# Altium footprint library IC.PcbLib: 386 footprints (part 30 of 30)
Each footprint in its own frame and in the unit in brackets; x right, y up, seen from the top. Pads: shape width x height; smd on the part's side, far side on the other; paste and mask are expansions set on the pad; w line width, h text height; cw(c..) or ccw(c..) is an arc to the next point about the centre after c.
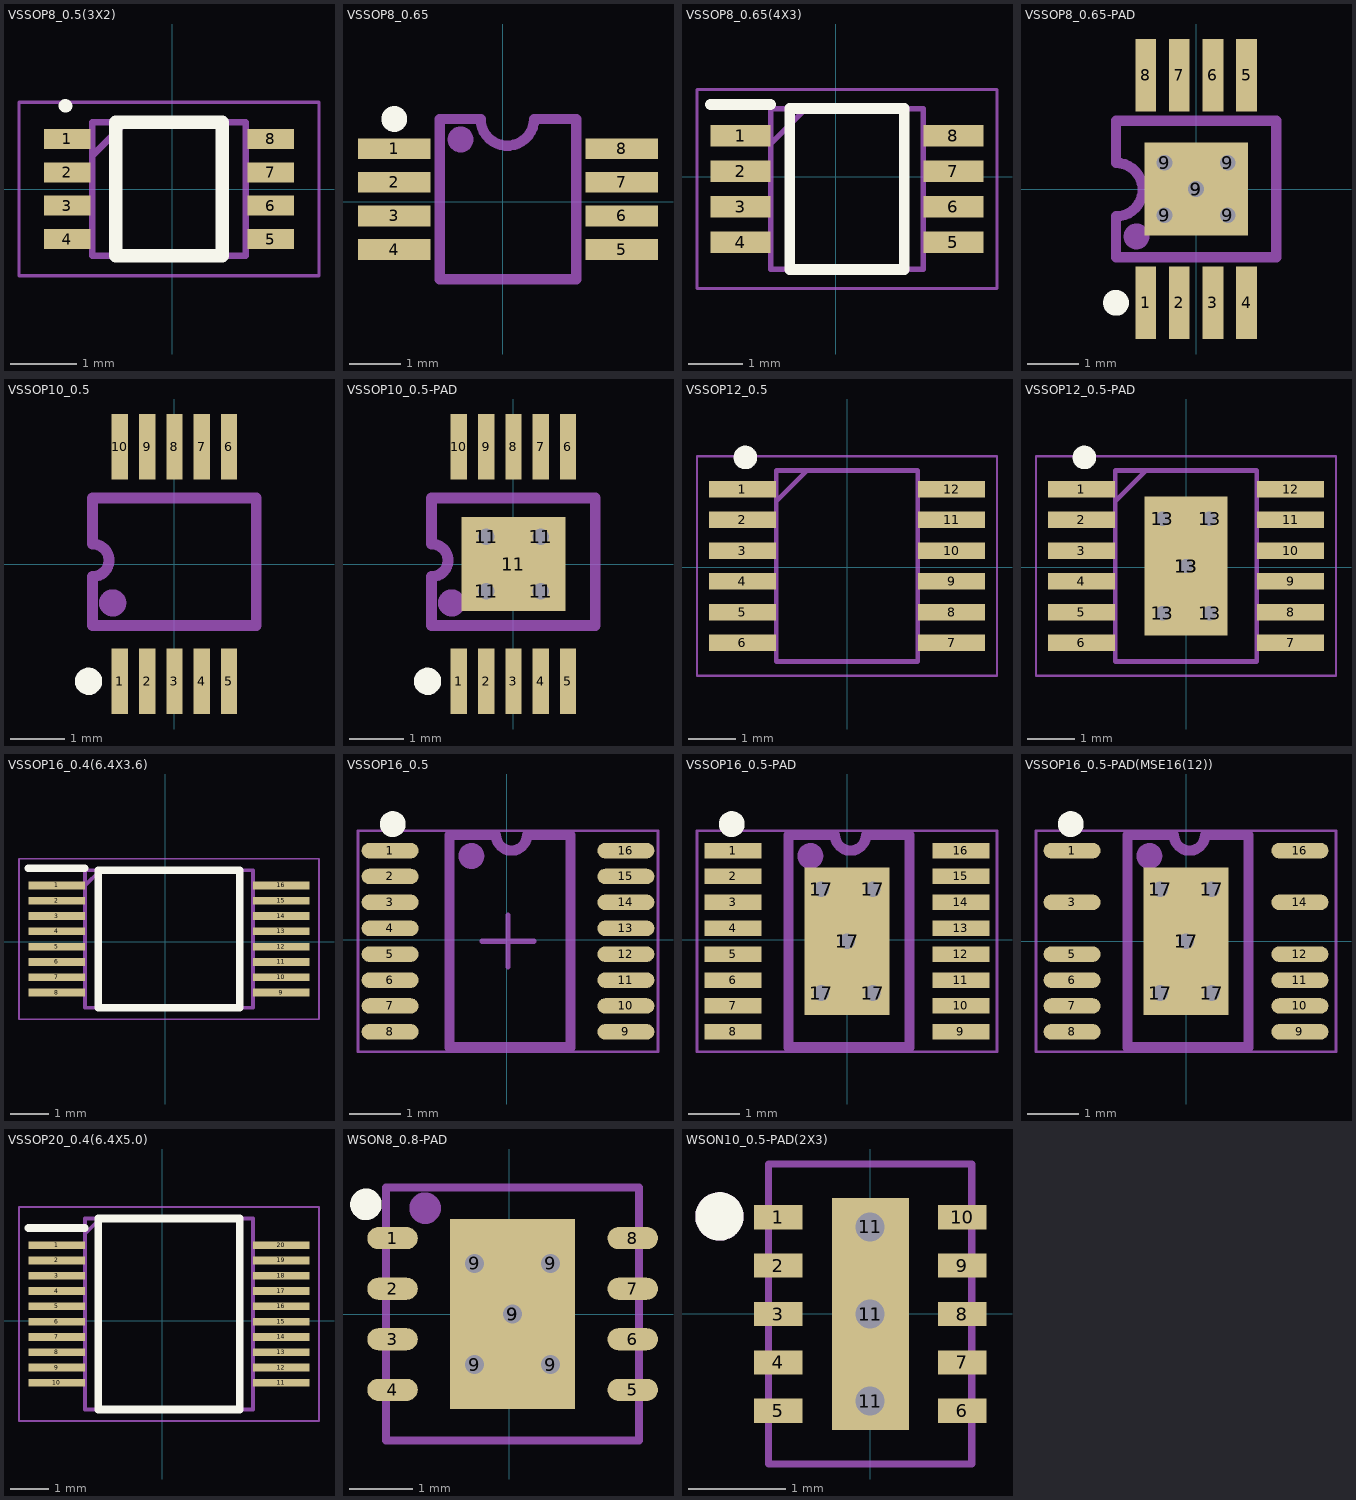
[diagram p29: the footprints below, top view; thin cyan lines are the x and y axes]

## VSSOP8_0.5(3X2) [mm]
pads (8):
  rect 0.7x0.3 smd: 1(-1.575,0.75) 2(-1.575,0.25) 3(-1.575,-0.25) 4(-1.575,-0.75) 5(1.473,-0.75) 6(1.473,-0.25) 7(1.473,0.25) 8(1.473,0.75)
Top Overlay:
  lines w0.2: -1.607,1.25 -1.6,1.245 ; -0.851,-1 -0.851,1 0.749,1 0.749,-1 -0.851,-1
Mechanical 13:
  lines w0.1: -1.201,0.5 -0.701,1 ; -1.201,-1 -1.201,1 1.099,1 1.099,-1 -1.201,-1
Mechanical 15:
  lines w0.05: -2.301,-1.3 -2.301,1.3 2.199,1.3 2.199,-1.3 -2.301,-1.3
3D body "SN74LVC2T45DCUR.stp": height 0.9, standoff 0, extent -1.601,-1 1.499,1

## VSSOP8_0.65 [mm]
pads (8):
  rect 1.4x0.4 smd: 1(-2.098,1.026) 2(-2.098,0.376) 3(-2.098,-0.274) 4(-2.098,-0.924) 5(2.302,-0.924) 6(2.302,-0.274) 7(2.302,0.376) 8(2.302,1.026)
Top Overlay:
  circle w0.25: c-2.098,1.6 r0.125
Mechanical 15:
  circle w0.25: c-0.815,1.204 r0.125
  lines w0.2: -1.219,-1.499 -1.219,1.601 -0.428,1.601 ccw(c0.089,1.601) 0.606,1.601 1.422,1.601 1.422,-1.499 -1.219,-1.499
3D body "VSSOP8-0.65.STEP": height 1.15, standoff 0, extent -2.42,-1.575 2.623,1.525

## VSSOP8_0.65(4X3) [mm]
pads (8):
  rect 1.1x0.4 smd: 1(-1.747,0.746) 2(-1.747,0.096) 3(-1.747,-0.554) 4(-1.747,-1.204) 5(2.153,-1.204) 6(2.153,-0.554) 7(2.153,0.096) 8(2.153,0.746)
Top Overlay:
  lines w0.2: -2.297,1.321 -1.197,1.321 ; -0.847,-1.704 1.253,-1.704 1.253,1.246 -0.847,1.246 -0.847,-1.704
Mechanical 13:
  lines w0.1: -1.197,0.596 -0.547,1.246 ; -1.197,-1.704 1.603,-1.704 1.603,1.246 -1.197,1.246 -1.197,-1.704
Mechanical 15:
  lines w0.05: -2.547,-2.054 2.953,-2.054 2.953,1.596 -2.547,1.596 -2.547,-2.054
3D body "TXS0102DCTR.stp": height 1.3, standoff 0, extent -1.797,-1.704 2.203,1.246

## VSSOP8_0.65-PAD [mm]
pads (14):
  rect 0.4x1.4 smd: 1(-0.975,-2.2) 2(-0.325,-2.2) 3(0.325,-2.2) 4(0.975,-2.2) 5(0.975,2.2) 6(0.325,2.2) 7(-0.325,2.2) 8(-0.975,2.2)
  round 0.61 hole 0.305: 9(-0.61,-0.508) 9(-0.61,0.508) 9(0,0) 9(0.61,-0.508) 9(0.61,0.508)
  rect 2x1.8 smd paste-3: 9(0,0)
Top Overlay:
  circle w0.25: c-1.549,-2.2 r0.125
Top Paste:
  region: -0.94,0.864 -0.94,0.125 -0.125,0.125 -0.125,0.864
  region: 0.125,0.864 0.125,0.125 0.94,0.125 0.94,0.864
  region: 0.94,-0.864 0.94,-0.125 0.125,-0.125 0.125,-0.864
  region: -0.125,-0.864 -0.125,-0.125 -0.94,-0.125 -0.94,-0.864
Mechanical 15:
  circle w0.25: c-1.153,-0.917 r0.125
  lines w0.2: -1.55,-1.321 1.55,-1.321 1.55,1.321 -1.55,1.321 -1.55,0.504 cw(c-1.55,-0.013) -1.55,-0.529 -1.55,-1.321
3D body "VSSOP8-0.65.STEP": height 1.15, standoff 0, extent -1.474,-2.522 1.626,2.522

## VSSOP10_0.5 [mm]
pads (10):
  rect 0.3x1.2 smd: 1(-1,-2.15) 2(-0.5,-2.15) 3(0,-2.15) 4(0.5,-2.15) 5(1,-2.15) 6(1,2.15) 7(0.5,2.15) 8(0,2.15) 9(-0.5,2.15) 10(-1,2.15)
Top Overlay:
  circle w0.25: c-1.574,-2.15 r0.125
Mechanical 15:
  circle w0.25: c-1.133,-0.713 r0.125
  lines w0.2: -1.5,-0.241 -1.5,-1.13 1.5,-1.13 1.5,1.207 -1.5,1.207 -1.5,0.368 cw(c-1.5,0.068) -1.5,-0.232
3D body "MSOP10.STEP": height 1.15, standoff 0, extent -1.475,-2.386 1.525,2.514

## VSSOP10_0.5-PAD [mm]
pads (15):
  rect 0.3x1.2 smd: 1(-1,-2.15) 2(-0.5,-2.15) 3(0,-2.15) 4(0.5,-2.15) 5(1,-2.15) 6(1,2.15) 7(0.5,2.15) 8(0,2.15) 9(-0.5,2.15) 10(-1,2.15)
  round 0.61 hole 0.305: 11(-0.5,-0.5) 11(-0.5,0.5) 11(0.5,-0.5) 11(0.5,0.5)
  rect 1.9x1.73 smd paste-2: 11(0,0)
Top Overlay:
  circle w0.25: c-1.574,-2.15 r0.125
Top Paste:
  region: -0.125,-0.813 -0.125,-0.125 -0.914,-0.125 -0.914,-0.813
  region: -0.914,0.813 -0.914,0.125 -0.125,0.125 -0.125,0.813
  region: 0.125,0.813 0.125,0.125 0.914,0.125 0.914,0.813
  region: 0.914,-0.813 0.914,-0.125 0.125,-0.125 0.125,-0.813
Mechanical 15:
  circle w0.25: c-1.133,-0.713 r0.125
  lines w0.2: -1.5,-0.241 -1.5,-1.13 1.5,-1.13 1.5,1.207 -1.5,1.207 -1.5,0.368 cw(c-1.5,0.068) -1.5,-0.232
3D body "MSOP10.STEP": height 1.15, standoff 0, extent -1.475,-2.386 1.525,2.514

## VSSOP12_0.5 [mm]
height 1.1
pads (12):
  rect 1.425x0.35 smd: 1(-2.212,1.65) 2(-2.212,1) 3(-2.212,0.35) 4(-2.212,-0.3) 5(-2.212,-0.95) 6(-2.212,-1.6) 7(2.212,-1.6) 8(2.212,-0.95) 9(2.212,-0.3) 10(2.212,0.35) 11(2.212,1) 12(2.212,1.65)
Top Overlay:
  circle w0.25: c-2.151,2.324 r0.125
Mechanical 13:
  lines w0.1: -1.5,1.395 -0.85,2.045 ; -1.5,-1.995 -1.5,2.045 1.5,2.045 1.5,-1.995 -1.5,-1.995
Mechanical 15:
  lines w0.05: -3.175,-2.295 -3.175,2.345 3.175,2.345 3.175,-2.295 -3.175,-2.295
3D body "LTC3127EMSE#PBF.stp": height 1.1, standoff 0, extent -2.45,-1.982 2.45,2.057

## VSSOP12_0.5-PAD [mm]
height 1.1
pads (18):
  rect 1.425x0.35 smd: 1(-2.212,1.65) 2(-2.212,1) 3(-2.212,0.35) 4(-2.212,-0.3) 5(-2.212,-0.95) 6(-2.212,-1.6) 7(2.212,-1.6) 8(2.212,-0.95) 9(2.212,-0.3) 10(2.212,0.35) 11(2.212,1) 12(2.212,1.65)
  round 0.6 hole 0.3: 13(-0.5,-0.975) 13(-0.5,1.025) 13(0,0.025) 13(0.5,-0.975) 13(0.5,1.025)
  rect 1.753x2.947 smd: 13(0,0.025)
Top Overlay:
  circle w0.25: c-2.151,2.324 r0.125
Mechanical 13:
  lines w0.1: -1.5,1.395 -0.85,2.045 ; -1.5,-1.995 1.5,-1.995 1.5,2.045 -1.5,2.045 -1.5,-1.995
Mechanical 15:
  lines w0.05: -3.175,-2.295 3.175,-2.295 3.175,2.345 -3.175,2.345 -3.175,-2.295
3D body "LTC3127EMSE#PBF.stp": height 1.1, standoff 0, extent -2.45,-1.982 2.45,2.057

## VSSOP16_0.4(6.4X3.6) [mm]
pads (16):
  rect 1.475x0.2 smd: 1(-2.836,1.476) 2(-2.836,1.076) 3(-2.836,0.676) 4(-2.836,0.276) 5(-2.836,-0.124) 6(-2.836,-0.524) 7(-2.836,-0.924) 8(-2.836,-1.324) 9(3.04,-1.324) 10(3.04,-0.924) 11(3.04,-0.524) 12(3.04,-0.124) 13(3.04,0.276) 14(3.04,0.676) 15(3.04,1.076) 16(3.04,1.476)
Top Overlay:
  lines w0.2: -3.573,1.926 -2.098,1.926 ; -1.748,-1.724 1.952,-1.724 1.952,1.876 -1.748,1.876 -1.748,-1.724
Mechanical 13:
  lines w0.1: -2.098,1.476 -1.698,1.876 ; -2.098,-1.724 2.302,-1.724 2.302,1.876 -2.098,1.876 -2.098,-1.724
Mechanical 15:
  lines w0.05: -3.823,-2.024 4.027,-2.024 4.027,2.176 -3.823,2.176 -3.823,-2.024
3D body "SN74AVC4T245DGVR.stp": height 1.2, standoff 0, extent -3.098,-1.724 3.302,1.876

## VSSOP16_0.5 [mm] "TSSOP, 16-Leads, Body 4.04x3.00mm, Pitch 0.50mm, Thermal Pad 2.95x1.76mm, IPC Medium Density"
height 1.1
pads (16):
  oval 1.1x0.3 smd: 1(-2.251,1.725) 2(-2.251,1.225) 3(-2.251,0.725) 4(-2.251,0.225) 5(-2.251,-0.275) 6(-2.251,-0.775) 7(-2.251,-1.275) 8(-2.251,-1.775) 9(2.302,-1.775) 10(2.302,-1.275) 11(2.302,-0.775) 12(2.302,-0.275) 13(2.302,0.225) 14(2.302,0.725) 15(2.302,1.225) 16(2.302,1.725)
Top Overlay:
  circle w0.25: c-2.2,2.235 r0.125
Mechanical 15:
  circle w0.25: c-0.682,1.619 r0.125
  lines w0.05: -2.87,-2.159 2.921,-2.159 2.921,2.108 -2.87,2.108 -2.87,-2.159
  lines w0.1: -0.475,-0.025 0.525,-0.025 ; 0.025,-0.525 0.025,0.475
  lines w0.2: -0.216,2.025 -1.105,2.025 -1.105,-2.075 1.232,-2.075 1.232,2.025 0.394,2.025 cw(c0.094,2.025) -0.206,2.025
3D body "VSSOP16-0.5.STEP": height 0.86, standoff 0, extent -2.424,-2.045 2.476,1.994

## VSSOP16_0.5-PAD [mm] "TSSOP, 16-Leads, Body 4.04x3.00mm, Pitch 0.50mm, Thermal Pad 2.95x1.76mm, IPC Medium Density"
height 1.1
pads (22):
  rect 1.1x0.3 smd: 1(-2.2,1.725) 2(-2.2,1.225) 3(-2.2,0.725) 4(-2.2,0.225) 5(-2.2,-0.275) 6(-2.2,-0.775) 7(-2.2,-1.275) 8(-2.2,-1.775) 9(2.2,-1.775) 10(2.2,-1.275) 11(2.2,-0.775) 12(2.2,-0.275) 13(2.2,0.225) 14(2.2,0.725) 15(2.2,1.225) 16(2.2,1.725)
  round 0.6 hole 0.3: 17(-0.5,-1.025) 17(-0.5,0.975) 17(0,-0.025) 17(0.5,-1.025) 17(0.5,0.975)
  rect 1.65x2.85 smd paste-3: 17(0,-0.025)
Top Overlay:
  circle w0.25: c-2.225,2.235 r0.125
Top Paste:
  region: 0.787,1.346 0.125,1.346 0.125,0.1 0.787,0.1
  rectangle: -0.787,0.1 -0.125,1.346
  rectangle: -0.787,-1.397 -0.125,-0.15
  region: 0.787,-0.15 0.125,-0.15 0.125,-1.397 0.787,-1.397
Mechanical 15:
  circle w0.25: c-0.707,1.619 r0.125
  lines w0.05: -2.896,-2.159 2.896,-2.159 2.896,2.108 -2.896,2.108 -2.896,-2.159
  lines w0.1: -0.5,-0.025 0.5,-0.025 ; 0,-0.525 0,0.475
  lines w0.2: -0.241,2.025 -1.13,2.025 -1.13,-2.075 1.206,-2.075 1.206,2.025 0.368,2.025 cw(c0.068,2.025) -0.232,2.025
3D body "VSSOP16-0.5.STEP": height 0.86, standoff 0, extent -2.45,-2.045 2.45,1.994

## VSSOP16_0.5-PAD(MSE16(12)) [mm] "TSSOP, 16-Leads, Body 4.04x3.00mm, Pitch 0.50mm, Thermal Pad 2.95x1.76mm, IPC Medium Density"
height 1.1
pads (18):
  oval 1.1x0.3 smd: 1(-2.2,1.75) 3(-2.2,0.75) 5(-2.2,-0.25) 6(-2.2,-0.75) 7(-2.2,-1.25) 8(-2.2,-1.75) 9(2.2,-1.75) 10(2.2,-1.25) 11(2.2,-0.75) 12(2.2,-0.25) 14(2.2,0.75) 16(2.2,1.75)
  round 0.6 hole 0.3: 17(-0.5,-1) 17(-0.5,1) 17(0,0) 17(0.5,-1) 17(0.5,1)
  rect 1.65x2.85 smd paste-2: 17(0,0)
Top Overlay:
  circle w0.25: c-2.225,2.261 r0.125
Top Paste:
  region: 0.787,1.372 0.125,1.372 0.125,0.125 0.787,0.125
  rectangle: -0.787,0.125 -0.125,1.372
  rectangle: -0.787,-1.372 -0.125,-0.125
  region: 0.787,-0.125 0.125,-0.125 0.125,-1.372 0.787,-1.372
Mechanical 15:
  circle w0.25: c-0.707,1.644 r0.125
  lines w0.05: -2.896,-2.134 -2.896,2.134 2.896,2.134 2.896,-2.134 -2.896,-2.134
  lines w0.1: -0.5,0 0.5,0 ; 0,-0.5 0,0.5
  lines w0.2: -0.241,2.05 -1.13,2.05 -1.13,-2.05 1.206,-2.05 1.206,2.05 0.368,2.05 cw(c0.068,2.05) -0.232,2.05
3D body "MSE16(12)-0.5.STEP": height 0.86, standoff 0, extent -2.45,-2.02 2.45,2.019

## VSSOP20_0.4(6.4X5.0) [mm]
pads (20):
  rect 1.475x0.2 smd: 1(-2.76,1.978) 2(-2.76,1.578) 3(-2.76,1.178) 4(-2.76,0.778) 5(-2.76,0.378) 6(-2.76,-0.022) 7(-2.76,-0.422) 8(-2.76,-0.822) 9(-2.76,-1.222) 10(-2.76,-1.622) 11(3.116,-1.622) 12(3.116,-1.222) 13(3.116,-0.822) 14(3.116,-0.422) 15(3.116,-0.022) 16(3.116,0.378) 17(3.116,0.778) 18(3.116,1.178) 19(3.116,1.578) 20(3.116,1.978)
Top Overlay:
  lines w0.2: -3.497,2.428 -2.022,2.428 ; -1.672,-2.322 -1.672,2.678 2.028,2.678 2.028,-2.322 -1.672,-2.322
Mechanical 13:
  lines w0.1: -2.022,2.278 -1.622,2.678 ; -2.022,-2.322 -2.022,2.678 2.378,2.678 2.378,-2.322 -2.022,-2.322
Mechanical 15:
  lines w0.05: -3.747,-2.622 -3.747,2.978 4.103,2.978 4.103,-2.622 -3.747,-2.622
3D body "SN74LVC244ADGVR.stp": height 1.2, standoff 0, extent -3.022,-2.322 3.378,2.678

## WSON8_0.8-PAD [mm]
pads (14):
  oval 0.8x0.35 smd: 1(-1.849,1.2) 2(-1.849,0.4) 3(-1.849,-0.4) 4(-1.849,-1.2) 5(1.951,-1.2) 6(1.951,-0.4) 7(1.951,0.4) 8(1.951,1.2)
  round 0.6 hole 0.3: 9(-0.549,-0.8) 9(-0.549,0.8) 9(0.051,0) 9(0.651,-0.8) 9(0.651,0.8)
  rect 1.98x3 smd paste-3: 9(0.051,0)
Top Overlay:
  circle w0.25: c-2.271,1.735 r0.125
Top Paste:
  region: 0.94,1.397 0.176,1.397 0.176,0.125 0.94,0.125
  rectangle: -0.838,0.125 -0.074,1.397
  rectangle: -0.838,-1.397 -0.074,-0.125
  region: 0.94,-0.125 0.176,-0.125 0.176,-1.397 0.94,-1.397
Mechanical 15:
  circle w0.25: c-1.334,1.675 r0.125
  lines w0.127: -1.949,-2 -1.949,2 2.051,2 2.051,-2 -1.949,-2
3D body "WSON8-4X4.STEP": height 0.87, standoff 0, extent -1.949,-1.99 2.051,1.99

## WSON10_0.5-PAD(2X3) [mm]
pads (14):
  rect 0.5x0.25 smd: 1(-0.95,1) 2(-0.95,0.5) 3(-0.95,0) 4(-0.95,-0.5) 5(-0.95,-1) 6(0.95,-1) 7(0.95,-0.5) 8(0.95,0) 9(0.95,0.5) 10(0.95,1)
  round 0.6 hole 0.3: 11(0,0) 11(0,-0.9) 11(0,0.9)
  rect 0.8x2.4 smd: 11(0.003,0)
Top Overlay:
  circle w0.25: c-1.557,1.008 r0.125
Mechanical 15:
  circle w0.25: c-1.557,1.008 r0.125
  lines w0.076: -1.05,-1.55 -1.05,1.55 1.05,1.55 1.05,-1.55 -1.05,-1.55
3D body "WSON10-2X3.STEP": height 0.74, standoff -0.01, extent -1.001,-1.5 1.001,1.5